# Altium schematic symbol library Linear Technology Comparators.SchLib: 630 symbols (part 15 of 16)
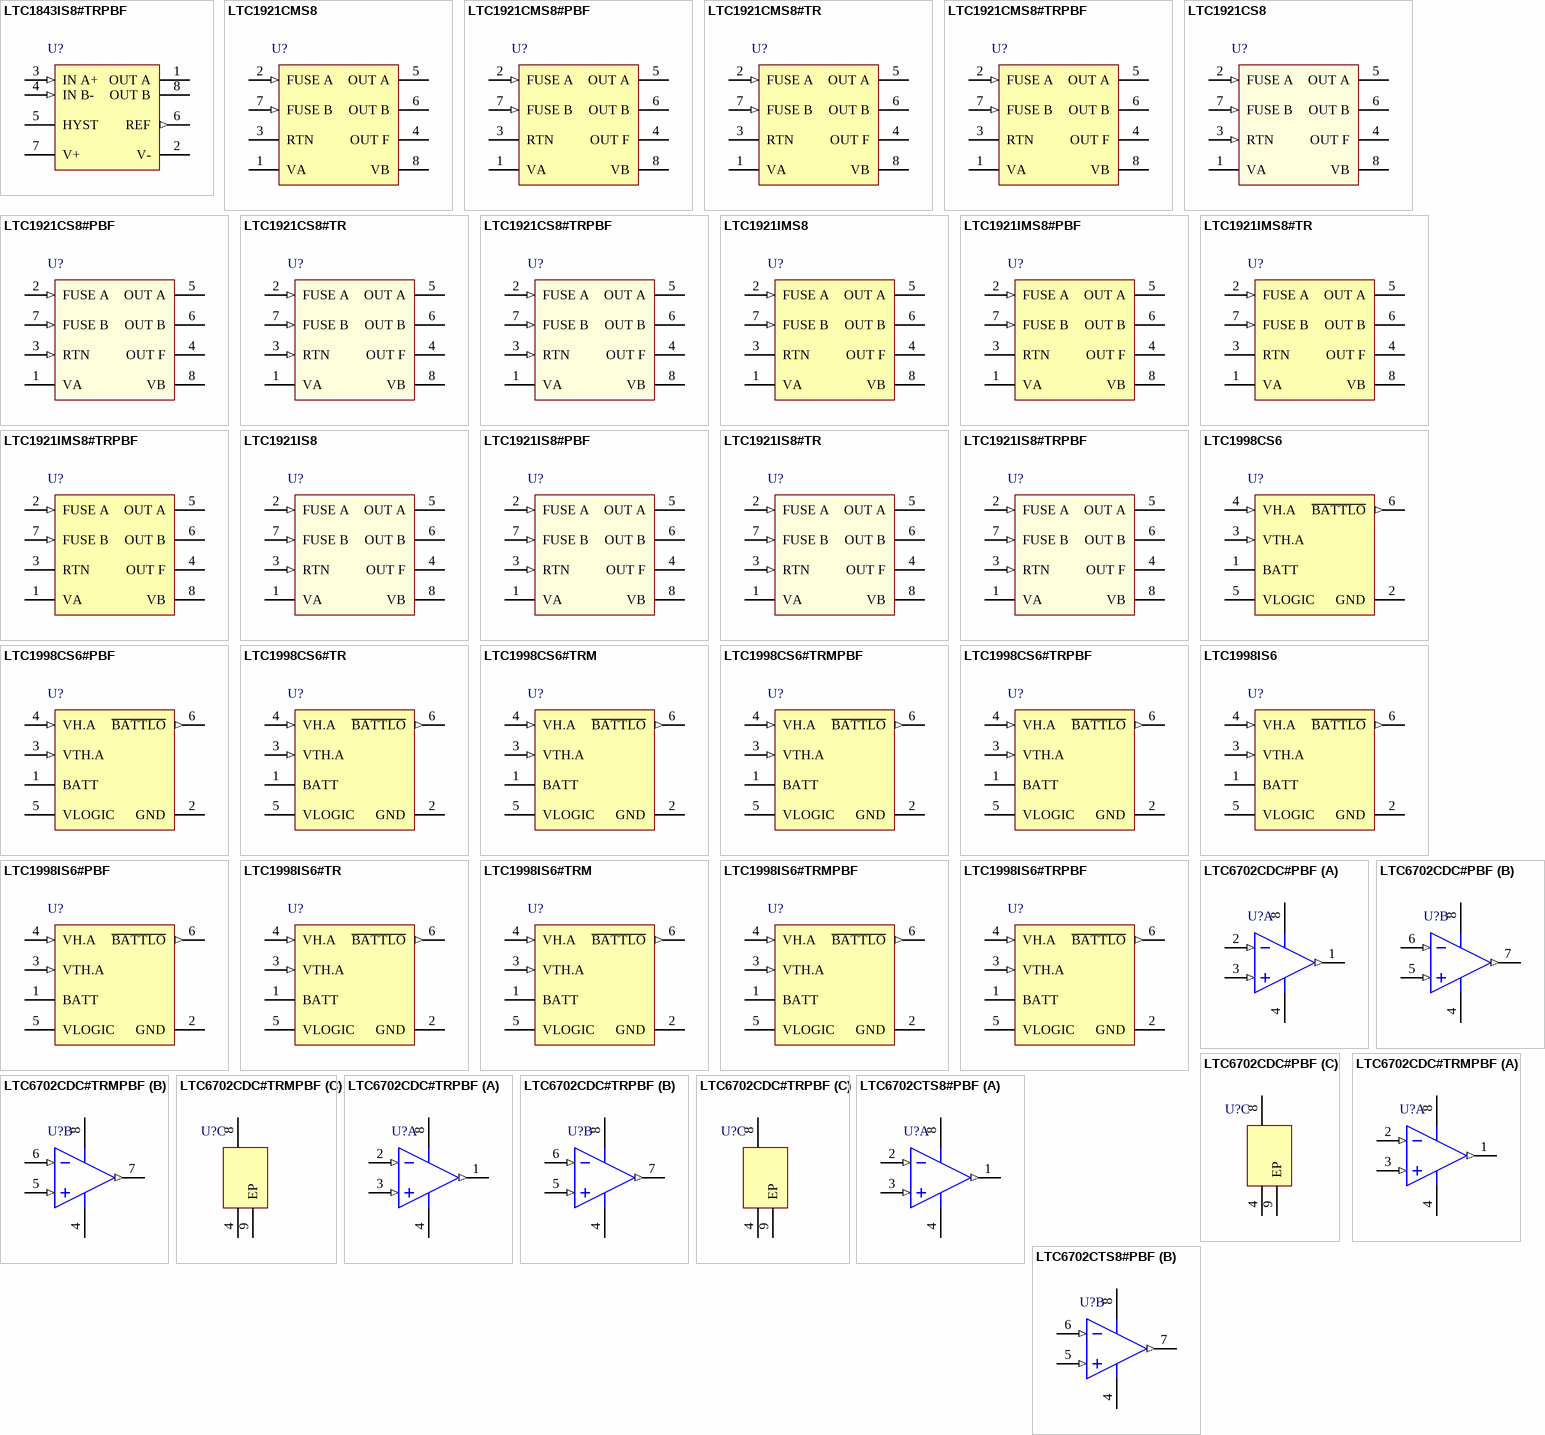
[diagram p38: symbols LTC1843IS8#TRPBF to LTC6702CTS8#PBF]

## LTC1921CS8#PBF
designator U?
-48 V Supply and Fuse Monitor, 2 Channels, -10 to -80 V, 0 to +70 degC, 8-pin SOP (S8); Generic Part Number: LTC1921; Manufacturer: Linear Technology; PartNumber: LTC1921CS8#PBF; Channels (#): 2; Prop Delay (us): 220; Supply Current (uA) Guaranteed: 250; Supply Current (uA) Typical: 160; Vs Max (V): 11; PackageReference: S8; PackageDescription: 8-Pin Plastic Small Outline (Narrow .150 Inch), Body 4.9 x 3.9 mm, Pitch 1.27 mm; Supplier 1: Digi-Key; Supplier Part Number 1: LTC1921CS8#PBF-ND; Features: Comparator; RoHS: Y; Supply Voltage Range: -10 to -80 V; Vs Min (V): 2; Mounting Technology: Surface Mount; ComponentLink1Description: Manufacturer URL; ComponentLink1URL: http://www.linear.com/; ComponentLink2Description: Datasheet; ComponentLink2URL: http://cds.linear.com/docs/en/datasheet/1921f.pdf; ComponentLink3Description: Package Specification; ComponentLink3URL: http://cds.linear.com/docs/en/packaging/05081610_G_SO8.pdf
footprint LT-S8_N (SOP, 8-Leads, Body 4.9x3.9mm, Pitch 1.27mm, IPC Medium Density)
footprint LT-S8_L (SOP, 8-Leads, Body 4.9x3.9mm, Pitch 1.27mm, IPC High Density)
footprint LT-S8_M (SOP, 8-Leads, Body 4.9x3.9mm, Pitch 1.27mm, IPC Low Density)
pins: 1 VA (power) "Supply to be Monitored. The voltage at this pin is compared to the valid supply voltage window and the result is output at OUT A (Pin 5). Supply current is drawn from VA as well as from VB (Pin 8).", 2 FUSE A (in) "This pin monitors the state of a fuse by comparing the voltage at this pin to the voltage at VA (Pin 1). The result is output at OUT F (Pin 4).", 3 RTN (in) "Supply Return Reference. This pin must be at an equal or higher potential than the other pins and should be wired to the -48V return.", 4 OUT F "This pin indicates the state of the external fuses by ORing thecomparisons made to the FUSE A and FUSE B pins(see the datasheet).", 5 OUT A "Indicates the state of VA. If VA is within the specified voltage window (neither undervoltage nor overvoltage), OUT A will exhibit a high internal impedance to the OUT F pin. If VA is outside the specified overvoltage or (See Datasheet)", 6 OUT B "Indicates the state of VB. If VB is within the specified voltage window (neither undervoltage nor overvoltage), OUT B will exhibit a high internal impedance to the OUT A pin. If VB is outside the specified overvoltage or (See Datasheet)", 7 FUSE B (in) "This pin monitors the state of a fuse by comparing the voltage at this pin to the voltage at VB (Pin 8). The result is output at OUT F (Pin 4).", 8 VB (power) "Supply to be Monitored. The voltage at this pin is compared to the valid supply voltage window and the result is output at OUT B (Pin 6). Supply current is drawn from VB as well as from VA (Pin 1)."

## LTC1921CS8#TR
designator U?
-48 V Supply and Fuse Monitor, 2 Channels, -10 to -80 V, 0 to +70 degC, 8-pin SOP (S8), Tape and Reel; Generic Part Number: LTC1921; Manufacturer: Linear Technology; PartNumber: LTC1921CS8#TR; Channels (#): 2; Prop Delay (us): 220; Supply Current (uA) Guaranteed: 250; Supply Current (uA) Typical: 160; Vs Max (V): 11; PackageReference: S8; PackageDescription: 8-Pin Plastic Small Outline (Narrow .150 Inch), Body 4.9 x 3.9 mm, Pitch 1.27 mm; Supplier 1: Digi-Key; Supplier Part Number 1: LTC1921CS8TR-ND; Features: Comparator; RoHS: N; Supply Voltage Range: -10 to -80 V; Vs Min (V): 2; Mounting Technology: Surface Mount; ComponentLink1Description: Manufacturer URL; ComponentLink1URL: http://www.linear.com/; ComponentLink2Description: Datasheet; ComponentLink2URL: http://cds.linear.com/docs/en/datasheet/1921f.pdf; ComponentLink3Description: Package Specification; ComponentLink3URL: http://cds.linear.com/docs/en/packaging/05081610_G_SO8.pdf
footprint LT-S8_N (SOP, 8-Leads, Body 4.9x3.9mm, Pitch 1.27mm, IPC Medium Density)
footprint LT-S8_L (SOP, 8-Leads, Body 4.9x3.9mm, Pitch 1.27mm, IPC High Density)
footprint LT-S8_M (SOP, 8-Leads, Body 4.9x3.9mm, Pitch 1.27mm, IPC Low Density)
pins: 1 VA (power) "Supply to be Monitored. The voltage at this pin is compared to the valid supply voltage window and the result is output at OUT A (Pin 5). Supply current is drawn from VA as well as from VB (Pin 8).", 2 FUSE A (in) "This pin monitors the state of a fuse by comparing the voltage at this pin to the voltage at VA (Pin 1). The result is output at OUT F (Pin 4).", 3 RTN (in) "Supply Return Reference. This pin must be at an equal or higher potential than the other pins and should be wired to the -48V return.", 4 OUT F "This pin indicates the state of the external fuses by ORing thecomparisons made to the FUSE A and FUSE B pins(see the datasheet).", 5 OUT A "Indicates the state of VA. If VA is within the specified voltage window (neither undervoltage nor overvoltage), OUT A will exhibit a high internal impedance to the OUT F pin. If VA is outside the specified overvoltage or (See Datasheet)", 6 OUT B "Indicates the state of VB. If VB is within the specified voltage window (neither undervoltage nor overvoltage), OUT B will exhibit a high internal impedance to the OUT A pin. If VB is outside the specified overvoltage or (See Datasheet)", 7 FUSE B (in) "This pin monitors the state of a fuse by comparing the voltage at this pin to the voltage at VB (Pin 8). The result is output at OUT F (Pin 4).", 8 VB (power) "Supply to be Monitored. The voltage at this pin is compared to the valid supply voltage window and the result is output at OUT B (Pin 6). Supply current is drawn from VB as well as from VA (Pin 1)."

## LTC1921CS8#TRPBF
designator U?
-48 V Supply and Fuse Monitor, 2 Channels, -10 to -80 V, 0 to +70 degC, 8-pin SOP (S8), Tape and Reel; Generic Part Number: LTC1921; Manufacturer: Linear Technology; PartNumber: LTC1921CS8#TRPBF; Channels (#): 2; Prop Delay (us): 220; Supply Current (uA) Guaranteed: 250; Supply Current (uA) Typical: 160; Vs Max (V): 11; PackageReference: S8; PackageDescription: 8-Pin Plastic Small Outline (Narrow .150 Inch), Body 4.9 x 3.9 mm, Pitch 1.27 mm; Supplier 1: Digi-Key; Supplier Part Number 1: LTC1921CS8#TRPBF-ND; Features: Comparator; RoHS: Y; Supply Voltage Range: -10 to -80 V; Vs Min (V): 2; Mounting Technology: Surface Mount; ComponentLink1Description: Manufacturer URL; ComponentLink1URL: http://www.linear.com/; ComponentLink2Description: Datasheet; ComponentLink2URL: http://cds.linear.com/docs/en/datasheet/1921f.pdf; ComponentLink3Description: Package Specification; ComponentLink3URL: http://cds.linear.com/docs/en/packaging/05081610_G_SO8.pdf
footprint LT-S8_N (SOP, 8-Leads, Body 4.9x3.9mm, Pitch 1.27mm, IPC Medium Density)
footprint LT-S8_L (SOP, 8-Leads, Body 4.9x3.9mm, Pitch 1.27mm, IPC High Density)
footprint LT-S8_M (SOP, 8-Leads, Body 4.9x3.9mm, Pitch 1.27mm, IPC Low Density)
pins: 1 VA (power) "Supply to be Monitored. The voltage at this pin is compared to the valid supply voltage window and the result is output at OUT A (Pin 5). Supply current is drawn from VA as well as from VB (Pin 8).", 2 FUSE A (in) "This pin monitors the state of a fuse by comparing the voltage at this pin to the voltage at VA (Pin 1). The result is output at OUT F (Pin 4).", 3 RTN (in) "Supply Return Reference. This pin must be at an equal or higher potential than the other pins and should be wired to the -48V return.", 4 OUT F "This pin indicates the state of the external fuses by ORing thecomparisons made to the FUSE A and FUSE B pins(see the datasheet).", 5 OUT A "Indicates the state of VA. If VA is within the specified voltage window (neither undervoltage nor overvoltage), OUT A will exhibit a high internal impedance to the OUT F pin. If VA is outside the specified overvoltage or (See Datasheet)", 6 OUT B "Indicates the state of VB. If VB is within the specified voltage window (neither undervoltage nor overvoltage), OUT B will exhibit a high internal impedance to the OUT A pin. If VB is outside the specified overvoltage or (See Datasheet)", 7 FUSE B (in) "This pin monitors the state of a fuse by comparing the voltage at this pin to the voltage at VB (Pin 8). The result is output at OUT F (Pin 4).", 8 VB (power) "Supply to be Monitored. The voltage at this pin is compared to the valid supply voltage window and the result is output at OUT B (Pin 6). Supply current is drawn from VB as well as from VA (Pin 1)."

## LTC1921IMS8
designator U?
-48 V Supply and Fuse Monitor, 2 Channels, -10 to -80 V, -40 to +85 degC, 8-pin Plastic MSOP (MS8); Generic Part Number: LTC1921; Manufacturer: Linear Technology; PartNumber: LTC1921IMS8; Channels (#): 2; Prop Delay (us): 220; Supply Current (uA) Guaranteed: 250; Supply Current (uA) Typical: 160; Vs Max (V): 11; PackageReference: MS8; PackageDescription: 8-Pin Plastic MSOP, Body 3 x 3 mm, Pitch 0.65 mm; Supplier 1: Digi-Key; Supplier Part Number 1: LTC1921IMS8-ND; Features: Comparator; RoHS: N; Supply Voltage Range: -10 to -80 V; Vs Min (V): 2; Mounting Technology: Surface Mount; ComponentLink1Description: Manufacturer URL; ComponentLink1URL: http://www.linear.com/; ComponentLink2Description: Datasheet; ComponentLink2URL: http://cds.linear.com/docs/en/datasheet/1921f.pdf; ComponentLink3Description: Package Specification; ComponentLink3URL: http://cds.linear.com/docs/en/packaging/MSOP_8_05-08-1660.pdf
footprint LT-MS8_N (SOP, 8-Leads, Body 3x3mm, Pitch 0.65mm, IPC Medium Density)
footprint LT-MS8_L (SOP, 8-Leads, Body 3x3mm, Pitch 0.65mm, IPC High Density)
footprint LT-MS8_M (SOP, 8-Leads, Body 3x3mm, Pitch 0.65mm, IPC Low Density)
pins: 1 VA (power) "Supply to be Monitored. The voltage at this pin is compared to the valid supply voltage window and the result is output at OUT A (Pin 5). Supply current is drawn from VA as well as from VB (Pin 8).", 2 FUSE A (in) "This pin monitors the state of a fuse by comparing the voltage at this pin to the voltage at VA (Pin 1). The result is output at OUT F (Pin 4).", 3 RTN "Supply Return Reference. This pin must be at an equal or higher potential than the other pins and should be wired to the -48V return.", 4 OUT F "This pin indicates the state of the external fuses by ORing the comparisons made to the FUSE A and FUSE B pins.(See the datasheet)", 5 OUT A "Indicates the state of VA. If VA is within the specified voltage window (neither undervoltage nor overvoltage), OUT A will exhibit a high internal impedance to the OUT F pin. If VA is outside the specified overvoltage or (See Datasheet)", 6 OUT B "Indicates the state of VB. If VB is within the specified voltage window (neither undervoltage nor overvoltage), OUT B will exhibit a high internal impedance to the OUT A pin. If VB is outside the specified overvoltage or (See Datasheet)", 7 FUSE B (in) "This pin monitors the state of a fuse by comparing the voltage at this pin to the voltage at VB (Pin 8). The result is output at OUT F (Pin 4).", 8 VB (power) "Supply to be Monitored. The voltage at this pin is compared to the valid supply voltage window and the result is output at OUT B (Pin 6). Supply current is drawn from VB as well as from VA (Pin 1)."

## LTC1921IMS8#PBF
designator U?
-48 V Supply and Fuse Monitor, 2 Channels, -10 to -80 V, -40 to +85 degC, 8-pin Plastic MSOP (MS8); Generic Part Number: LTC1921; Manufacturer: Linear Technology; PartNumber: LTC1921IMS8#PBF; Channels (#): 2; Prop Delay (us): 220; Supply Current (uA) Guaranteed: 250; Supply Current (uA) Typical: 160; Vs Max (V): 11; PackageReference: MS8; PackageDescription: 8-Pin Plastic MSOP, Body 3 x 3 mm, Pitch 0.65 mm; Supplier 1: Digi-Key; Supplier Part Number 1: LTC1921IMS8#PBF-ND; Supplier 2: Newark; Supplier Part Number 2: 56M4328; Features: Comparator; RoHS: Y; Supply Voltage Range: -10 to -80 V; Vs Min (V): 2; Mounting Technology: Surface Mount; ComponentLink1Description: Manufacturer URL; ComponentLink1URL: http://www.linear.com/; ComponentLink2Description: Datasheet; ComponentLink2URL: http://cds.linear.com/docs/en/datasheet/1921f.pdf; ComponentLink3Description: Package Specification; ComponentLink3URL: http://cds.linear.com/docs/en/packaging/MSOP_8_05-08-1660.pdf
footprint LT-MS8_N (SOP, 8-Leads, Body 3x3mm, Pitch 0.65mm, IPC Medium Density)
footprint LT-MS8_L (SOP, 8-Leads, Body 3x3mm, Pitch 0.65mm, IPC High Density)
footprint LT-MS8_M (SOP, 8-Leads, Body 3x3mm, Pitch 0.65mm, IPC Low Density)
pins: 1 VA (power) "Supply to be Monitored. The voltage at this pin is compared to the valid supply voltage window and the result is output at OUT A (Pin 5). Supply current is drawn from VA as well as from VB (Pin 8).", 2 FUSE A (in) "This pin monitors the state of a fuse by comparing the voltage at this pin to the voltage at VA (Pin 1). The result is output at OUT F (Pin 4).", 3 RTN "Supply Return Reference. This pin must be at an equal or higher potential than the other pins and should be wired to the -48V return.", 4 OUT F "This pin indicates the state of the external fuses by ORing the comparisons made to the FUSE A and FUSE B pins.(See the datasheet)", 5 OUT A "Indicates the state of VA. If VA is within the specified voltage window (neither undervoltage nor overvoltage), OUT A will exhibit a high internal impedance to the OUT F pin. If VA is outside the specified overvoltage or (See Datasheet)", 6 OUT B "Indicates the state of VB. If VB is within the specified voltage window (neither undervoltage nor overvoltage), OUT B will exhibit a high internal impedance to the OUT A pin. If VB is outside the specified overvoltage or (See Datasheet)", 7 FUSE B (in) "This pin monitors the state of a fuse by comparing the voltage at this pin to the voltage at VB (Pin 8). The result is output at OUT F (Pin 4).", 8 VB (power) "Supply to be Monitored. The voltage at this pin is compared to the valid supply voltage window and the result is output at OUT B (Pin 6). Supply current is drawn from VB as well as from VA (Pin 1)."

## LTC1921IMS8#TR
designator U?
-48 V Supply and Fuse Monitor, 2 Channels, -10 to -80 V, -40 to +85 degC, 8-pin Plastic MSOP (MS8), Tape and Reel; Generic Part Number: LTC1921; Manufacturer: Linear Technology; PartNumber: LTC1921IMS8#TR; Channels (#): 2; Prop Delay (us): 220; Supply Current (uA) Guaranteed: 250; Supply Current (uA) Typical: 160; Vs Max (V): 11; PackageReference: MS8; PackageDescription: 8-Pin Plastic MSOP, Body 3 x 3 mm, Pitch 0.65 mm; Supplier 1: Digi-Key; Supplier Part Number 1: LTC1921IMS8TR-ND; Features: Comparator; RoHS: N; Supply Voltage Range: -10 to -80 V; Vs Min (V): 2; Mounting Technology: Surface Mount; ComponentLink1Description: Manufacturer URL; ComponentLink1URL: http://www.linear.com/; ComponentLink2Description: Datasheet; ComponentLink2URL: http://cds.linear.com/docs/en/datasheet/1921f.pdf; ComponentLink3Description: Package Specification; ComponentLink3URL: http://cds.linear.com/docs/en/packaging/MSOP_8_05-08-1660.pdf
footprint LT-MS8_N (SOP, 8-Leads, Body 3x3mm, Pitch 0.65mm, IPC Medium Density)
footprint LT-MS8_L (SOP, 8-Leads, Body 3x3mm, Pitch 0.65mm, IPC High Density)
footprint LT-MS8_M (SOP, 8-Leads, Body 3x3mm, Pitch 0.65mm, IPC Low Density)
pins: 1 VA (power) "Supply to be Monitored. The voltage at this pin is compared to the valid supply voltage window and the result is output at OUT A (Pin 5). Supply current is drawn from VA as well as from VB (Pin 8).", 2 FUSE A (in) "This pin monitors the state of a fuse by comparing the voltage at this pin to the voltage at VA (Pin 1). The result is output at OUT F (Pin 4).", 3 RTN "Supply Return Reference. This pin must be at an equal or higher potential than the other pins and should be wired to the -48V return.", 4 OUT F "This pin indicates the state of the external fuses by ORing the comparisons made to the FUSE A and FUSE B pins.(See the datasheet)", 5 OUT A "Indicates the state of VA. If VA is within the specified voltage window (neither undervoltage nor overvoltage), OUT A will exhibit a high internal impedance to the OUT F pin. If VA is outside the specified overvoltage or (See Datasheet)", 6 OUT B "Indicates the state of VB. If VB is within the specified voltage window (neither undervoltage nor overvoltage), OUT B will exhibit a high internal impedance to the OUT A pin. If VB is outside the specified overvoltage or (See Datasheet)", 7 FUSE B (in) "This pin monitors the state of a fuse by comparing the voltage at this pin to the voltage at VB (Pin 8). The result is output at OUT F (Pin 4).", 8 VB (power) "Supply to be Monitored. The voltage at this pin is compared to the valid supply voltage window and the result is output at OUT B (Pin 6). Supply current is drawn from VB as well as from VA (Pin 1)."

## LTC1921IMS8#TRPBF
designator U?
-48 V Supply and Fuse Monitor, 2 Channels, -10 to -80 V, -40 to +85 degC, 8-pin Plastic MSOP (MS8), Tape and Reel; Generic Part Number: LTC1921; Manufacturer: Linear Technology; PartNumber: LTC1921IMS8#TRPBF; Channels (#): 2; Prop Delay (us): 220; Supply Current (uA) Guaranteed: 250; Supply Current (uA) Typical: 160; Vs Max (V): 11; PackageReference: MS8; PackageDescription: 8-Pin Plastic MSOP, Body 3 x 3 mm, Pitch 0.65 mm; Supplier 1: Digi-Key; Supplier Part Number 1: LTC1921IMS8#TRPBF-ND; Supplier 2: Newark; Supplier Part Number 2: 56M4330; Features: Comparator; RoHS: Y; Supply Voltage Range: -10 to -80 V; Vs Min (V): 2; Mounting Technology: Surface Mount; ComponentLink1Description: Manufacturer URL; ComponentLink1URL: http://www.linear.com/; ComponentLink2Description: Datasheet; ComponentLink2URL: http://cds.linear.com/docs/en/datasheet/1921f.pdf; ComponentLink3Description: Package Specification; ComponentLink3URL: http://cds.linear.com/docs/en/packaging/MSOP_8_05-08-1660.pdf
footprint LT-MS8_N (SOP, 8-Leads, Body 3x3mm, Pitch 0.65mm, IPC Medium Density)
footprint LT-MS8_L (SOP, 8-Leads, Body 3x3mm, Pitch 0.65mm, IPC High Density)
footprint LT-MS8_M (SOP, 8-Leads, Body 3x3mm, Pitch 0.65mm, IPC Low Density)
pins: 1 VA (power) "Supply to be Monitored. The voltage at this pin is compared to the valid supply voltage window and the result is output at OUT A (Pin 5). Supply current is drawn from VA as well as from VB (Pin 8).", 2 FUSE A (in) "This pin monitors the state of a fuse by comparing the voltage at this pin to the voltage at VA (Pin 1). The result is output at OUT F (Pin 4).", 3 RTN "Supply Return Reference. This pin must be at an equal or higher potential than the other pins and should be wired to the -48V return.", 4 OUT F "This pin indicates the state of the external fuses by ORing the comparisons made to the FUSE A and FUSE B pins.(See the datasheet)", 5 OUT A "Indicates the state of VA. If VA is within the specified voltage window (neither undervoltage nor overvoltage), OUT A will exhibit a high internal impedance to the OUT F pin. If VA is outside the specified overvoltage or (See Datasheet)", 6 OUT B "Indicates the state of VB. If VB is within the specified voltage window (neither undervoltage nor overvoltage), OUT B will exhibit a high internal impedance to the OUT A pin. If VB is outside the specified overvoltage or (See Datasheet)", 7 FUSE B (in) "This pin monitors the state of a fuse by comparing the voltage at this pin to the voltage at VB (Pin 8). The result is output at OUT F (Pin 4).", 8 VB (power) "Supply to be Monitored. The voltage at this pin is compared to the valid supply voltage window and the result is output at OUT B (Pin 6). Supply current is drawn from VB as well as from VA (Pin 1)."

## LTC1921IS8
designator U?
-48 V Supply and Fuse Monitor, 2 Channels, -10 to -80 V, -40 to +85 degC, 8-pin SOP (S8); Generic Part Number: LTC1921; Manufacturer: Linear Technology; PartNumber: LTC1921IS8; Channels (#): 2; Prop Delay (us): 220; Supply Current (uA) Guaranteed: 250; Supply Current (uA) Typical: 160; Vs Max (V): 11; PackageReference: S8; PackageDescription: 8-Pin Plastic Small Outline (Narrow .150 Inch), Body 4.9 x 3.9 mm, Pitch 1.27 mm; Supplier 1: Digi-Key; Supplier Part Number 1: LTC1921IS8-ND; Features: Comparator; RoHS: N; Supply Voltage Range: -10 to -80 V; Vs Min (V): 2; Mounting Technology: Surface Mount; ComponentLink1Description: Manufacturer URL; ComponentLink1URL: http://www.linear.com/; ComponentLink2Description: Datasheet; ComponentLink2URL: http://cds.linear.com/docs/en/datasheet/1921f.pdf; ComponentLink3Description: Package Specification; ComponentLink3URL: http://cds.linear.com/docs/en/packaging/05081610_G_SO8.pdf
footprint LT-S8_N (SOP, 8-Leads, Body 4.9x3.9mm, Pitch 1.27mm, IPC Medium Density)
footprint LT-S8_L (SOP, 8-Leads, Body 4.9x3.9mm, Pitch 1.27mm, IPC High Density)
footprint LT-S8_M (SOP, 8-Leads, Body 4.9x3.9mm, Pitch 1.27mm, IPC Low Density)
pins: 1 VA (power) "Supply to be Monitored. The voltage at this pin is compared to the valid supply voltage window and the result is output at OUT A (Pin 5). Supply current is drawn from VA as well as from VB (Pin 8).", 2 FUSE A (in) "This pin monitors the state of a fuse by comparing the voltage at this pin to the voltage at VA (Pin 1). The result is output at OUT F (Pin 4).", 3 RTN (in) "Supply Return Reference. This pin must be at an equal or higher potential than the other pins and should be wired to the -48V return.", 4 OUT F "This pin indicates the state of the external fuses by ORing thecomparisons made to the FUSE A and FUSE B pins(see the datasheet).", 5 OUT A "Indicates the state of VA. If VA is within the specified voltage window (neither undervoltage nor overvoltage), OUT A will exhibit a high internal impedance to the OUT F pin. If VA is outside the specified overvoltage or (See Datasheet)", 6 OUT B "Indicates the state of VB. If VB is within the specified voltage window (neither undervoltage nor overvoltage), OUT B will exhibit a high internal impedance to the OUT A pin. If VB is outside the specified overvoltage or (See Datasheet)", 7 FUSE B (in) "This pin monitors the state of a fuse by comparing the voltage at this pin to the voltage at VB (Pin 8). The result is output at OUT F (Pin 4).", 8 VB (power) "Supply to be Monitored. The voltage at this pin is compared to the valid supply voltage window and the result is output at OUT B (Pin 6). Supply current is drawn from VB as well as from VA (Pin 1)."

## LTC1921IS8#PBF
designator U?
-48 V Supply and Fuse Monitor, 2 Channels, -10 to -80 V, -40 to +85 degC, 8-pin SOP (S8); Generic Part Number: LTC1921; Manufacturer: Linear Technology; PartNumber: LTC1921IS8#PBF; Channels (#): 2; Prop Delay (us): 220; Supply Current (uA) Guaranteed: 250; Supply Current (uA) Typical: 160; Vs Max (V): 11; PackageReference: S8; PackageDescription: 8-Pin Plastic Small Outline (Narrow .150 Inch), Body 4.9 x 3.9 mm, Pitch 1.27 mm; Supplier 1: Digi-Key; Supplier Part Number 1: LTC1921IS8#PBF-ND; Features: Comparator; RoHS: Y; Supply Voltage Range: -10 to -80 V; Vs Min (V): 2; Mounting Technology: Surface Mount; ComponentLink1Description: Manufacturer URL; ComponentLink1URL: http://www.linear.com/; ComponentLink2Description: Datasheet; ComponentLink2URL: http://cds.linear.com/docs/en/datasheet/1921f.pdf; ComponentLink3Description: Package Specification; ComponentLink3URL: http://cds.linear.com/docs/en/packaging/05081610_G_SO8.pdf
footprint LT-S8_N (SOP, 8-Leads, Body 4.9x3.9mm, Pitch 1.27mm, IPC Medium Density)
footprint LT-S8_L (SOP, 8-Leads, Body 4.9x3.9mm, Pitch 1.27mm, IPC High Density)
footprint LT-S8_M (SOP, 8-Leads, Body 4.9x3.9mm, Pitch 1.27mm, IPC Low Density)
pins: 1 VA (power) "Supply to be Monitored. The voltage at this pin is compared to the valid supply voltage window and the result is output at OUT A (Pin 5). Supply current is drawn from VA as well as from VB (Pin 8).", 2 FUSE A (in) "This pin monitors the state of a fuse by comparing the voltage at this pin to the voltage at VA (Pin 1). The result is output at OUT F (Pin 4).", 3 RTN (in) "Supply Return Reference. This pin must be at an equal or higher potential than the other pins and should be wired to the -48V return.", 4 OUT F "This pin indicates the state of the external fuses by ORing thecomparisons made to the FUSE A and FUSE B pins(see the datasheet).", 5 OUT A "Indicates the state of VA. If VA is within the specified voltage window (neither undervoltage nor overvoltage), OUT A will exhibit a high internal impedance to the OUT F pin. If VA is outside the specified overvoltage or (See Datasheet)", 6 OUT B "Indicates the state of VB. If VB is within the specified voltage window (neither undervoltage nor overvoltage), OUT B will exhibit a high internal impedance to the OUT A pin. If VB is outside the specified overvoltage or (See Datasheet)", 7 FUSE B (in) "This pin monitors the state of a fuse by comparing the voltage at this pin to the voltage at VB (Pin 8). The result is output at OUT F (Pin 4).", 8 VB (power) "Supply to be Monitored. The voltage at this pin is compared to the valid supply voltage window and the result is output at OUT B (Pin 6). Supply current is drawn from VB as well as from VA (Pin 1)."

## LTC1921IS8#TR
designator U?
-48 V Supply and Fuse Monitor, 2 Channels, -10 to -80 V, -40 to +85 degC, 8-pin SOP (S8), Tape and Reel; Generic Part Number: LTC1921; Manufacturer: Linear Technology; PartNumber: LTC1921IS8#TR; Channels (#): 2; Prop Delay (us): 220; Supply Current (uA) Guaranteed: 250; Supply Current (uA) Typical: 160; Vs Max (V): 11; PackageReference: S8; PackageDescription: 8-Pin Plastic Small Outline (Narrow .150 Inch), Body 4.9 x 3.9 mm, Pitch 1.27 mm; Supplier 1: Digi-Key; Supplier Part Number 1: LTC1921IS8TR-ND; Features: Comparator; RoHS: N; Supply Voltage Range: -10 to -80 V; Vs Min (V): 2; Mounting Technology: Surface Mount; ComponentLink1Description: Manufacturer URL; ComponentLink1URL: http://www.linear.com/; ComponentLink2Description: Datasheet; ComponentLink2URL: http://cds.linear.com/docs/en/datasheet/1921f.pdf; ComponentLink3Description: Package Specification; ComponentLink3URL: http://cds.linear.com/docs/en/packaging/05081610_G_SO8.pdf
footprint LT-S8_N (SOP, 8-Leads, Body 4.9x3.9mm, Pitch 1.27mm, IPC Medium Density)
footprint LT-S8_L (SOP, 8-Leads, Body 4.9x3.9mm, Pitch 1.27mm, IPC High Density)
footprint LT-S8_M (SOP, 8-Leads, Body 4.9x3.9mm, Pitch 1.27mm, IPC Low Density)
pins: 1 VA (power) "Supply to be Monitored. The voltage at this pin is compared to the valid supply voltage window and the result is output at OUT A (Pin 5). Supply current is drawn from VA as well as from VB (Pin 8).", 2 FUSE A (in) "This pin monitors the state of a fuse by comparing the voltage at this pin to the voltage at VA (Pin 1). The result is output at OUT F (Pin 4).", 3 RTN (in) "Supply Return Reference. This pin must be at an equal or higher potential than the other pins and should be wired to the -48V return.", 4 OUT F "This pin indicates the state of the external fuses by ORing thecomparisons made to the FUSE A and FUSE B pins(see the datasheet).", 5 OUT A "Indicates the state of VA. If VA is within the specified voltage window (neither undervoltage nor overvoltage), OUT A will exhibit a high internal impedance to the OUT F pin. If VA is outside the specified overvoltage or (See Datasheet)", 6 OUT B "Indicates the state of VB. If VB is within the specified voltage window (neither undervoltage nor overvoltage), OUT B will exhibit a high internal impedance to the OUT A pin. If VB is outside the specified overvoltage or (See Datasheet)", 7 FUSE B (in) "This pin monitors the state of a fuse by comparing the voltage at this pin to the voltage at VB (Pin 8). The result is output at OUT F (Pin 4).", 8 VB (power) "Supply to be Monitored. The voltage at this pin is compared to the valid supply voltage window and the result is output at OUT B (Pin 6). Supply current is drawn from VB as well as from VA (Pin 1)."

## LTC1921IS8#TRPBF
designator U?
-48 V Supply and Fuse Monitor, 2 Channels, -10 to -80 V, -40 to +85 degC, 8-pin SOP (S8), Tape and Reel; Generic Part Number: LTC1921; Manufacturer: Linear Technology; PartNumber: LTC1921IS8#TRPBF; Channels (#): 2; Prop Delay (us): 220; Supply Current (uA) Guaranteed: 250; Supply Current (uA) Typical: 160; Vs Max (V): 11; PackageReference: S8; PackageDescription: 8-Pin Plastic Small Outline (Narrow .150 Inch), Body 4.9 x 3.9 mm, Pitch 1.27 mm; Supplier 1: Digi-Key; Supplier Part Number 1: LTC1921IS8#TRPBF-ND; Features: Comparator; RoHS: Y; Supply Voltage Range: -10 to -80 V; Vs Min (V): 2; Mounting Technology: Surface Mount; ComponentLink1Description: Manufacturer URL; ComponentLink1URL: http://www.linear.com/; ComponentLink2Description: Datasheet; ComponentLink2URL: http://cds.linear.com/docs/en/datasheet/1921f.pdf; ComponentLink3Description: Package Specification; ComponentLink3URL: http://cds.linear.com/docs/en/packaging/05081610_G_SO8.pdf
footprint LT-S8_N (SOP, 8-Leads, Body 4.9x3.9mm, Pitch 1.27mm, IPC Medium Density)
footprint LT-S8_L (SOP, 8-Leads, Body 4.9x3.9mm, Pitch 1.27mm, IPC High Density)
footprint LT-S8_M (SOP, 8-Leads, Body 4.9x3.9mm, Pitch 1.27mm, IPC Low Density)
pins: 1 VA (power) "Supply to be Monitored. The voltage at this pin is compared to the valid supply voltage window and the result is output at OUT A (Pin 5). Supply current is drawn from VA as well as from VB (Pin 8).", 2 FUSE A (in) "This pin monitors the state of a fuse by comparing the voltage at this pin to the voltage at VA (Pin 1). The result is output at OUT F (Pin 4).", 3 RTN (in) "Supply Return Reference. This pin must be at an equal or higher potential than the other pins and should be wired to the -48V return.", 4 OUT F "This pin indicates the state of the external fuses by ORing thecomparisons made to the FUSE A and FUSE B pins(see the datasheet).", 5 OUT A "Indicates the state of VA. If VA is within the specified voltage window (neither undervoltage nor overvoltage), OUT A will exhibit a high internal impedance to the OUT F pin. If VA is outside the specified overvoltage or (See Datasheet)", 6 OUT B "Indicates the state of VB. If VB is within the specified voltage window (neither undervoltage nor overvoltage), OUT B will exhibit a high internal impedance to the OUT A pin. If VB is outside the specified overvoltage or (See Datasheet)", 7 FUSE B (in) "This pin monitors the state of a fuse by comparing the voltage at this pin to the voltage at VB (Pin 8). The result is output at OUT F (Pin 4).", 8 VB (power) "Supply to be Monitored. The voltage at this pin is compared to the valid supply voltage window and the result is output at OUT B (Pin 6). Supply current is drawn from VB as well as from VA (Pin 1)."

## LTC1998CS6
designator U?
2.5 µA, 1 % Accurate SOT-23 Comparator and Voltage Reference for Battery Monitoring, 1 Channel, 1.5 to 5.5 V, 0 to +70 degC, 6-pin Plastic TSOT-23 (S6); Generic Part Number: LTC1998; Manufacturer: Linear Technology; PartNumber: LTC1998CS6; Channels (#): 1; Prop Delay (us): 150; Supply Current (uA) Typical: 3.5; Vs Max (V): 5.5; Vs Min (V): 1.5; DatasheetVersion: Rev B; PackageReference: S6; PackageDescription: 6-Pin Plastic TSOT-23, Body 2.9 x 1.63 mm, Pitch 0.95 mm; Features: Reference, Comparator; RoHS: N; Supply Voltage Range: 1.5 to 5.5 V; Mounting Technology: Surface Mount; Code_JEDEC: MO-193; ComponentLink1Description: Manufacturer URL; ComponentLink1URL: http://www.linear.com/; ComponentLink2Description: Datasheet; ComponentLink2URL: http://cds.linear.com/docs/en/datasheet/1998fb.pdf; ComponentLink3Description: Package Specification; ComponentLink3URL: http://cds.linear.com/docs/en/packaging/SOT_6_05-08-1636.pdf
footprint LT-S6_N (SOT23, 6-Leads, Body 2.9x1.63mm, Pitch 0.95mm, IPC Medium Density)
footprint LT-S6_L (SOT23, 6-Leads, Body 2.9x1.63mm, Pitch 0.95mm, IPC High Density)
footprint LT-S6_M (SOT23, 6-Leads, Body 2.9x1.63mm, Pitch 0.95mm, IPC Low Density)
pins: 1 BATT (power) "Battery Voltage to be monitored. Supply current is also drawn from this pin. Board layout should connect this pin to the battery(+) terminal, through a trace that does not conduct load current.?", 2 GND (power) "Ground should be connected to the battery (-) terminal through a trace that does not conduct load return current.", 3 VTH.A (in) "Threshold Adjust Pin. Adjusts the low battery threshold voltage, VBATT.Th = 2.5V + (VTH.A/2). VTH.A can be supplied by a voltage source or a resistor divider.", 4 VH.A (in) "Hysteresis Adjust. Hysteresis threshold voltage VTH2 = 2.5V + (VH.A/2). VH.A can be supplied by a voltage source or resistor divider. VH.A must always be programmed to a higher potential than VTH.A. Hysteresis voltage, VHYST (See Datasheet)", 5 VLOGIC (power) "Positive Supply Voltage for Output Driver. This voltage can be driven from an external logic supply or tied to BATT.", 6 ~{BATTLO} (out) "Output of Comparator. Low for BATT < VBATT.Th (low battery threshold voltage). Output state guaranteed for VBATT>=1.5V."